# Altium schematic symbol library SCHLIB.SchLib: 2608 symbols (part 17 of 20)
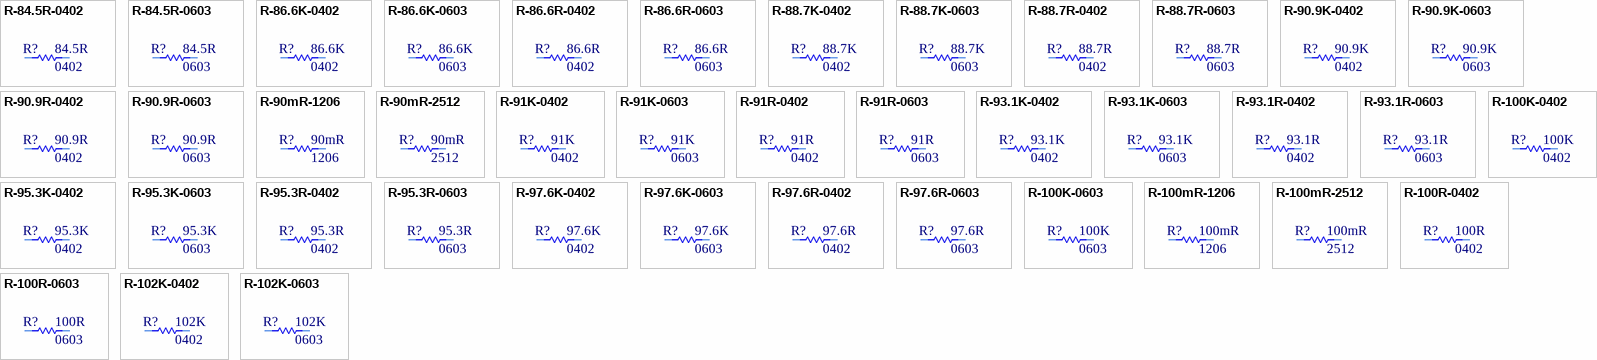
[diagram p99: symbols R-84.5R-0402 to R-102K-0603]

## R-100R-0402
designator R?, comment Package: 0402  (hidden comment: 100R)
RES 100 OHM 1% 1/16W 0402; Manufacturer Part Number: RC0402FR-07100RL; Manufacturer: YAGEO; Tolerance: 0.01; Power: 0.063W; Temperature Coefficient: ±100ppm/°C; Object  Type: Part; Design Item ID: R-100R-0402; Value: 100R; Composition: Thick Film; Features: Moisture Resistant; Operating Temperature: -55°C ~ 155°C; Height - Seated (Max): 0.40mm; Category: Resistor
footprint R0402
pins: 1, 2

## R-100R-0603
designator R?, comment Package: 0603  (hidden comment: 100R)
RES SMD 100 OHM 1% 1/10W 0603; Manufacturer Part Number: CRCW0603100RFKEA; Manufacturer: Vishay Dale; Tolerance: 0.01; Power: 0.1W; Temperature Coefficient: ±100ppm/°C; Object  Type: Part; Design Item ID: R-100R-0603; Value: 100R; Composition: Thick Film; Features: Automotive AEC-Q200; Operating Temperature: -55°C ~ 155°C; Height - Seated (Max): 0.50mm; Category: Resistor
footprint R0603
pins: 1, 2

## R-102K-0402
designator R?, comment Package: 0402  (hidden comment: 102K)
RES 102K OHM 1% 1/16W 0402; Manufacturer Part Number: RC0402FR-07102KL; Manufacturer: YAGEO; Tolerance: 0.01; Power: 0.063W; Temperature Coefficient: ±100ppm/°C; Object  Type: Part; Design Item ID: R-102K-0402; Value: 102K; Composition: Thick Film; Features: Moisture Resistant; Operating Temperature: -55°C ~ 155°C; Height - Seated (Max): 0.40mm; Category: Resistor
footprint R0402
pins: 1, 2

## R-102K-0603
designator R?, comment Package: 0603  (hidden comment: 102K)
RES SMD 102K OHM 1% 1/10W 0603; Manufacturer Part Number: CRCW0603102KFKEA; Manufacturer: Vishay Dale; Tolerance: 0.01; Power: 0.1W; Temperature Coefficient: ±100ppm/°C; Object  Type: Part; Design Item ID: R-102K-0603; Value: 102K; Composition: Thick Film; Features: Automotive AEC-Q200; Operating Temperature: -55°C ~ 155°C; Height - Seated (Max): 0.50mm; Category: Resistor
footprint R0603
pins: 1, 2

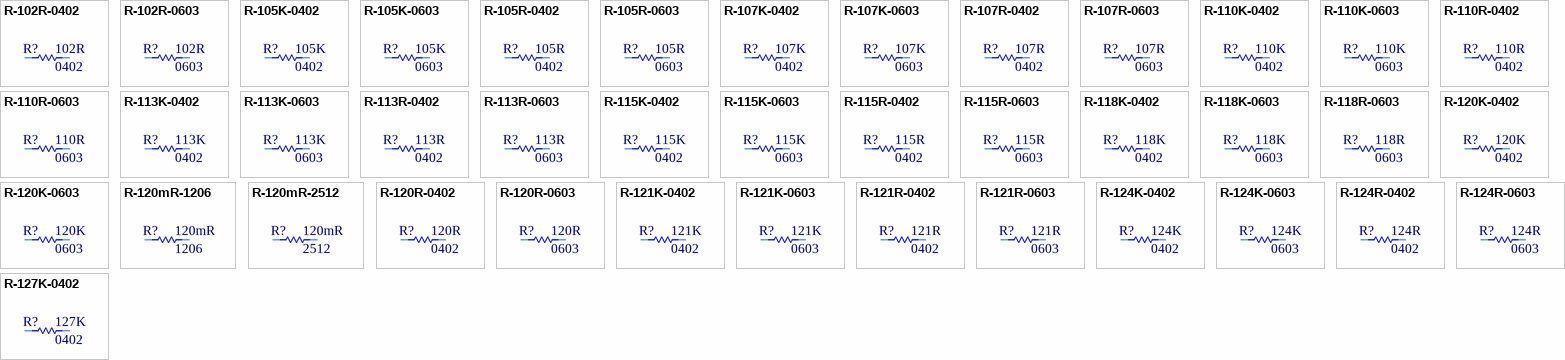
[diagram p70: symbols R-102R-0402 to R-127K-0402]

## R-102R-0402
designator R?, comment Package: 0402  (hidden comment: 102R)
RES 102 OHM 1% 1/16W 0402; Manufacturer Part Number: RC0402FR-07102RL; Manufacturer: YAGEO; Tolerance: 0.01; Power: 0.063W; Temperature Coefficient: ±100ppm/°C; Object  Type: Part; Design Item ID: R-102R-0402; Value: 102R; Composition: Thick Film; Features: Moisture Resistant; Operating Temperature: -55°C ~ 155°C; Height - Seated (Max): 0.40mm; Category: Resistor
footprint R0402
pins: 1, 2

## R-102R-0603
designator R?, comment Package: 0603  (hidden comment: 102R)
RES SMD 102 OHM 1% 1/10W 0603; Manufacturer Part Number: CRCW0603102RFKEA; Manufacturer: Vishay Dale; Tolerance: 0.01; Power: 0.1W; Temperature Coefficient: ±100ppm/°C; Object  Type: Part; Design Item ID: R-102R-0603; Value: 102R; Composition: Thick Film; Features: Automotive AEC-Q200; Operating Temperature: -55°C ~ 155°C; Height - Seated (Max): 0.50mm; Category: Resistor
footprint R0603
pins: 1, 2

## R-105K-0402
designator R?, comment Package: 0402  (hidden comment: 105K)
RES 105K OHM 1% 1/16W 0402; Manufacturer Part Number: RC0402FR-07105KL; Manufacturer: YAGEO; Tolerance: 0.01; Power: 0.063W; Temperature Coefficient: ±100ppm/°C; Object  Type: Part; Design Item ID: R-105K-0402; Value: 105K; Composition: Thick Film; Features: Moisture Resistant; Operating Temperature: -55°C ~ 155°C; Height - Seated (Max): 0.40mm; Category: Resistor
footprint R0402
pins: 1, 2

## R-105K-0603
designator R?, comment Package: 0603  (hidden comment: 105K)
RES SMD 105K OHM 1% 1/10W 0603; Manufacturer Part Number: CRCW0603105KFKEA; Manufacturer: Vishay Dale; Tolerance: 0.01; Power: 0.1W; Temperature Coefficient: ±100ppm/°C; Object  Type: Part; Design Item ID: R-105K-0603; Value: 105K; Composition: Thick Film; Features: Automotive AEC-Q200; Operating Temperature: -55°C ~ 155°C; Height - Seated (Max): 0.50mm; Category: Resistor
footprint R0603
pins: 1, 2

## R-105R-0402
designator R?, comment Package: 0402  (hidden comment: 105R)
RES 105 OHM 1% 1/16W 0402; Manufacturer Part Number: RC0402FR-07105RL; Manufacturer: YAGEO; Tolerance: 0.01; Power: 0.063W; Temperature Coefficient: ±100ppm/°C; Object  Type: Part; Design Item ID: R-105R-0402; Value: 105R; Composition: Thick Film; Features: Moisture Resistant; Operating Temperature: -55°C ~ 155°C; Height - Seated (Max): 0.40mm; Category: Resistor
footprint R0402
pins: 1, 2

## R-105R-0603
designator R?, comment Package: 0603  (hidden comment: 105R)
RES SMD 105 OHM 1% 1/10W 0603; Manufacturer Part Number: CRCW0603105RFKEA; Manufacturer: Vishay Dale; Tolerance: 0.01; Power: 0.1W; Temperature Coefficient: ±100ppm/°C; Object  Type: Part; Design Item ID: R-105R-0603; Value: 105R; Composition: Thick Film; Features: Automotive AEC-Q200; Operating Temperature: -55°C ~ 155°C; Height - Seated (Max): 0.50mm; Category: Resistor
footprint R0603
pins: 1, 2

## R-107K-0402
designator R?, comment Package: 0402  (hidden comment: 107K)
RES 107K OHM 1% 1/16W 0402; Manufacturer Part Number: RC0402FR-07107KL; Manufacturer: YAGEO; Tolerance: 0.01; Power: 0.063W; Temperature Coefficient: ±100ppm/°C; Object  Type: Part; Design Item ID: R-107K-0402; Value: 107K; Composition: Thick Film; Features: Moisture Resistant; Operating Temperature: -55°C ~ 155°C; Height - Seated (Max): 0.40mm; Category: Resistor
footprint R0402
pins: 1, 2

## R-107K-0603
designator R?, comment Package: 0603  (hidden comment: 107K)
RES SMD 107K OHM 1% 1/10W 0603; Manufacturer Part Number: CRCW0603107KFKEA; Manufacturer: Vishay Dale; Tolerance: 0.01; Power: 0.1W; Temperature Coefficient: ±100ppm/°C; Object  Type: Part; Design Item ID: R-107K-0603; Value: 107K; Composition: Thick Film; Features: Automotive AEC-Q200; Operating Temperature: -55°C ~ 155°C; Height - Seated (Max): 0.50mm; Category: Resistor
footprint R0603
pins: 1, 2

## R-107R-0402
designator R?, comment Package: 0402  (hidden comment: 107R)
RES 107 OHM 1% 1/16W 0402; Manufacturer Part Number: RC0402FR-07107RL; Manufacturer: YAGEO; Tolerance: 0.01; Power: 0.063W; Temperature Coefficient: ±100ppm/°C; Object  Type: Part; Design Item ID: R-107R-0402; Value: 107R; Composition: Thick Film; Features: Moisture Resistant; Operating Temperature: -55°C ~ 155°C; Height - Seated (Max): 0.40mm; Category: Resistor
footprint R0402
pins: 1, 2

## R-107R-0603
designator R?, comment Package: 0603  (hidden comment: 107R)
RES SMD 107 OHM 1% 1/10W 0603; Manufacturer Part Number: CRCW0603107RFKEA; Manufacturer: Vishay Dale; Tolerance: 0.01; Power: 0.1W; Temperature Coefficient: ±100ppm/°C; Object  Type: Part; Design Item ID: R-107R-0603; Value: 107R; Composition: Thick Film; Features: Automotive AEC-Q200; Operating Temperature: -55°C ~ 155°C; Height - Seated (Max): 0.50mm; Category: Resistor
footprint R0603
pins: 1, 2

## R-110K-0402
designator R?, comment Package: 0402  (hidden comment: 110K)
RES 110K OHM 1% 1/16W 0402; Manufacturer Part Number: RC0402FR-07110KL; Manufacturer: YAGEO; Tolerance: 0.01; Power: 0.063W; Temperature Coefficient: ±100ppm/°C; Object  Type: Part; Design Item ID: R-110K-0402; Value: 110K; Composition: Thick Film; Features: Moisture Resistant; Operating Temperature: -55°C ~ 155°C; Height - Seated (Max): 0.40mm; Category: Resistor
footprint R0402
pins: 1, 2

## R-110K-0603
designator R?, comment Package: 0603  (hidden comment: 110K)
RES SMD 110K OHM 1% 1/10W 0603; Manufacturer Part Number: CRCW0603110KFKEA; Manufacturer: Vishay Dale; Tolerance: 0.01; Power: 0.1W; Temperature Coefficient: ±100ppm/°C; Object  Type: Part; Design Item ID: R-110K-0603; Value: 110K; Composition: Thick Film; Features: Automotive AEC-Q200; Operating Temperature: -55°C ~ 155°C; Height - Seated (Max): 0.50mm; Category: Resistor
footprint R0603
pins: 1, 2

## R-110R-0402
designator R?, comment Package: 0402  (hidden comment: 110R)
RES 110 OHM 1% 1/16W 0402; Manufacturer Part Number: RC0402FR-07110RL; Manufacturer: YAGEO; Tolerance: 0.01; Power: 0.063W; Temperature Coefficient: ±100ppm/°C; Object  Type: Part; Design Item ID: R-110R-0402; Value: 110R; Composition: Thick Film; Features: Moisture Resistant; Operating Temperature: -55°C ~ 155°C; Height - Seated (Max): 0.40mm; Category: Resistor
footprint R0402
pins: 1, 2

## R-110R-0603
designator R?, comment Package: 0603  (hidden comment: 110R)
RES SMD 110 OHM 1% 1/10W 0603; Manufacturer Part Number: CRCW0603110RFKEA; Manufacturer: Vishay Dale; Tolerance: 0.01; Power: 0.1W; Temperature Coefficient: ±100ppm/°C; Object  Type: Part; Design Item ID: R-110R-0603; Value: 110R; Composition: Thick Film; Features: Automotive AEC-Q200; Operating Temperature: -55°C ~ 155°C; Height - Seated (Max): 0.50mm; Category: Resistor
footprint R0603
pins: 1, 2

## R-113K-0402
designator R?, comment Package: 0402  (hidden comment: 113K)
RES 113K OHM 1% 1/16W 0402; Manufacturer Part Number: RC0402FR-07113KL; Manufacturer: YAGEO; Tolerance: 0.01; Power: 0.063W; Temperature Coefficient: ±100ppm/°C; Object  Type: Part; Design Item ID: R-113K-0402; Value: 113K; Composition: Thick Film; Features: Moisture Resistant; Operating Temperature: -55°C ~ 155°C; Height - Seated (Max): 0.40mm; Category: Resistor
footprint R0402
pins: 1, 2

## R-113K-0603
designator R?, comment Package: 0603  (hidden comment: 113K)
RES SMD 113K OHM 1% 1/10W 0603; Manufacturer Part Number: CRCW0603113KFKEA; Manufacturer: Vishay Dale; Tolerance: 0.01; Power: 0.1W; Temperature Coefficient: ±100ppm/°C; Object  Type: Part; Design Item ID: R-113K-0603; Value: 113K; Composition: Thick Film; Features: Automotive AEC-Q200; Operating Temperature: -55°C ~ 155°C; Height - Seated (Max): 0.50mm; Category: Resistor
footprint R0603
pins: 1, 2

## R-113R-0402
designator R?, comment Package: 0402  (hidden comment: 113R)
RES 113 OHM 1% 1/16W 0402; Manufacturer Part Number: RC0402FR-07113RL; Manufacturer: YAGEO; Tolerance: 0.01; Power: 0.063W; Temperature Coefficient: ±100ppm/°C; Object  Type: Part; Design Item ID: R-113R-0402; Value: 113R; Composition: Thick Film; Features: Moisture Resistant; Operating Temperature: -55°C ~ 155°C; Height - Seated (Max): 0.40mm; Category: Resistor
footprint R0402
pins: 1, 2

## R-113R-0603
designator R?, comment Package: 0603  (hidden comment: 113R)
RES SMD 113 OHM 1% 1/10W 0603; Manufacturer Part Number: CRCW0603113RFKEA; Manufacturer: Vishay Dale; Tolerance: 0.01; Power: 0.1W; Temperature Coefficient: ±100ppm/°C; Object  Type: Part; Design Item ID: R-113R-0603; Value: 113R; Composition: Thick Film; Features: Automotive AEC-Q200; Operating Temperature: -55°C ~ 155°C; Height - Seated (Max): 0.50mm; Category: Resistor
footprint R0603
pins: 1, 2

## R-115K-0402
designator R?, comment Package: 0402  (hidden comment: 115K)
RES 115K OHM 1% 1/16W 0402; Manufacturer Part Number: RC0402FR-07115KL; Manufacturer: YAGEO; Tolerance: 0.01; Power: 0.063W; Temperature Coefficient: ±100ppm/°C; Object  Type: Part; Design Item ID: R-115K-0402; Value: 115K; Composition: Thick Film; Features: Moisture Resistant; Operating Temperature: -55°C ~ 155°C; Height - Seated (Max): 0.40mm; Category: Resistor
footprint R0402
pins: 1, 2

## R-115K-0603
designator R?, comment Package: 0603  (hidden comment: 115K)
RES SMD 115K OHM 1% 1/10W 0603; Manufacturer Part Number: CRCW0603115KFKEA; Manufacturer: Vishay Dale; Tolerance: 0.01; Power: 0.1W; Temperature Coefficient: ±100ppm/°C; Object  Type: Part; Design Item ID: R-115K-0603; Value: 115K; Composition: Thick Film; Features: Automotive AEC-Q200; Operating Temperature: -55°C ~ 155°C; Height - Seated (Max): 0.50mm; Category: Resistor
footprint R0603
pins: 1, 2

## R-115R-0402
designator R?, comment Package: 0402  (hidden comment: 115R)
RES 115 OHM 1% 1/16W 0402; Manufacturer Part Number: RC0402FR-07115RL; Manufacturer: YAGEO; Tolerance: 0.01; Power: 0.063W; Temperature Coefficient: ±100ppm/°C; Object  Type: Part; Design Item ID: R-115R-0402; Value: 115R; Composition: Thick Film; Features: Moisture Resistant; Operating Temperature: -55°C ~ 155°C; Height - Seated (Max): 0.40mm; Category: Resistor
footprint R0402
pins: 1, 2

## R-115R-0603
designator R?, comment Package: 0603  (hidden comment: 115R)
RES SMD 115 OHM 1% 1/10W 0603; Manufacturer Part Number: CRCW0603115RFKEA; Manufacturer: Vishay Dale; Tolerance: 0.01; Power: 0.1W; Temperature Coefficient: ±100ppm/°C; Object  Type: Part; Design Item ID: R-115R-0603; Value: 115R; Composition: Thick Film; Features: Automotive AEC-Q200; Operating Temperature: -55°C ~ 155°C; Height - Seated (Max): 0.50mm; Category: Resistor
footprint R0603
pins: 1, 2

## R-118K-0402
designator R?, comment Package: 0402  (hidden comment: 118K)
RES 118K OHM 1% 1/16W 0402; Manufacturer Part Number: RC0402FR-07118KL; Manufacturer: YAGEO; Tolerance: 0.01; Power: 0.063W; Temperature Coefficient: ±100ppm/°C; Object  Type: Part; Design Item ID: R-118K-0402; Value: 118K; Composition: Thick Film; Features: Moisture Resistant; Operating Temperature: -55°C ~ 155°C; Height - Seated (Max): 0.40mm; Category: Resistor
footprint R0402
pins: 1, 2

## R-118K-0603
designator R?, comment Package: 0603  (hidden comment: 118K)
RES SMD 118K OHM 1% 1/10W 0603; Manufacturer Part Number: CRCW0603118KFKEA; Manufacturer: Vishay Dale; Tolerance: 0.01; Power: 0.1W; Temperature Coefficient: ±100ppm/°C; Object  Type: Part; Design Item ID: R-118K-0603; Value: 118K; Composition: Thick Film; Features: Automotive AEC-Q200; Operating Temperature: -55°C ~ 155°C; Height - Seated (Max): 0.50mm; Category: Resistor
footprint R0603
pins: 1, 2

## R-118R-0603
designator R?, comment Package: 0603  (hidden comment: 118R)
RES SMD 118 OHM 1% 1/10W 0603; Manufacturer Part Number: CRCW0603118RFKEA; Manufacturer: Vishay Dale; Tolerance: 0.01; Power: 0.1W; Temperature Coefficient: ±100ppm/°C; Object  Type: Part; Design Item ID: R-118R-0603; Value: 118R; Composition: Thick Film; Features: Automotive AEC-Q200; Operating Temperature: -55°C ~ 155°C; Height - Seated (Max): 0.50mm; Category: Resistor
footprint R0603
pins: 1, 2

## R-120K-0402
designator R?, comment Package: 0402  (hidden comment: 120K)
RES 120K OHM 1% 1/16W 0402; Manufacturer Part Number: RC0402FR-07120KL; Manufacturer: YAGEO; Tolerance: 0.01; Power: 0.063W; Temperature Coefficient: ±100ppm/°C; Object  Type: Part; Design Item ID: R-120K-0402; Value: 120K; Composition: Thick Film; Features: Moisture Resistant; Operating Temperature: -55°C ~ 155°C; Height - Seated (Max): 0.40mm; Category: Resistor
footprint R0402
pins: 1, 2

## R-120K-0603
designator R?, comment Package: 0603  (hidden comment: 120K)
RES SMD 120K OHM 1% 1/10W 0603; Manufacturer Part Number: CRCW0603120KFKEA; Manufacturer: Vishay Dale; Tolerance: 0.01; Power: 0.1W; Temperature Coefficient: ±100ppm/°C; Object  Type: Part; Design Item ID: R-120K-0603; Value: 120K; Composition: Thick Film; Features: Automotive AEC-Q200; Operating Temperature: -55°C ~ 155°C; Height - Seated (Max): 0.50mm; Category: Resistor
footprint R0603
pins: 1, 2

## R-120mR-1206
designator R?, comment Package: 1206  (hidden comment: 120mR)
RES 0.12 OHM 1% 1/4W 1206; Manufacturer Part Number: WSL1206R1200FEA; Manufacturer: Vishay Dale; Tolerance: 0.01; Power: 0.25W; Temperature Coefficient: ±75ppm/°C; Object  Type: Part; Design Item ID: R-120mR-1206; Value: 120mR; Composition: Metal Element; Features: Anti-Sulfur, Automotive AEC-Q200, Current Sense, Moisture Resistant, Pulse Withstanding; Operating Temperature: -65°C ~ 170°C; Height - Seated (Max): 0.89mm; Category: Resistor
footprint R1206
pins: 1, 2

## R-120mR-2512
designator R?, comment Package: 2512  (hidden comment: 120mR)
RES 0.12 OHM 1% 1W 2512; Manufacturer Part Number: WSL2512R1200FEA; Manufacturer: Vishay Dale; Tolerance: 0.01; Temperature Coefficient: ±75ppm/°C; Object  Type: Part; Design Item ID: R-120mR-2512; Value: 120mR; Power: 1W; Composition: Metal Element; Features: Anti-Sulfur, Automotive AEC-Q200, Current Sense, Moisture Resistant, Pulse Withstanding; Operating Temperature: -65°C ~ 170°C; Height - Seated (Max): 0.89mm; Category: Resistor
footprint R2512
pins: 1, 2

## R-120R-0402
designator R?, comment Package: 0402  (hidden comment: 120R)
RES 120 OHM 1% 1/16W 0402; Manufacturer Part Number: RC0402FR-07120RL; Manufacturer: YAGEO; Tolerance: 0.01; Power: 0.063W; Temperature Coefficient: ±100ppm/°C; Object  Type: Part; Design Item ID: R-120R-0402; Value: 120R; Composition: Thick Film; Features: Moisture Resistant; Operating Temperature: -55°C ~ 155°C; Height - Seated (Max): 0.40mm; Category: Resistor
footprint R0402
pins: 1, 2

## R-120R-0603
designator R?, comment Package: 0603  (hidden comment: 120R)
RES SMD 120 OHM 1% 1/10W 0603; Manufacturer Part Number: CRCW0603120RFKEA; Manufacturer: Vishay Dale; Tolerance: 0.01; Power: 0.1W; Temperature Coefficient: ±100ppm/°C; Object  Type: Part; Design Item ID: R-120R-0603; Value: 120R; Composition: Thick Film; Features: Automotive AEC-Q200; Operating Temperature: -55°C ~ 155°C; Height - Seated (Max): 0.50mm; Category: Resistor
footprint R0603
pins: 1, 2

## R-121K-0402
designator R?, comment Package: 0402  (hidden comment: 121K)
RES 121K OHM 1% 1/16W 0402; Manufacturer Part Number: RC0402FR-07121KL; Manufacturer: YAGEO; Tolerance: 0.01; Power: 0.063W; Temperature Coefficient: ±100ppm/°C; Object  Type: Part; Design Item ID: R-121K-0402; Value: 121K; Composition: Thick Film; Features: Moisture Resistant; Operating Temperature: -55°C ~ 155°C; Height - Seated (Max): 0.40mm; Category: Resistor
footprint R0402
pins: 1, 2

## R-121K-0603
designator R?, comment Package: 0603  (hidden comment: 121K)
RES SMD 121K OHM 1% 1/10W 0603; Manufacturer Part Number: CRCW0603121KFKEA; Manufacturer: Vishay Dale; Tolerance: 0.01; Power: 0.1W; Temperature Coefficient: ±100ppm/°C; Object  Type: Part; Design Item ID: R-121K-0603; Value: 121K; Composition: Thick Film; Features: Automotive AEC-Q200; Operating Temperature: -55°C ~ 155°C; Height - Seated (Max): 0.50mm; Category: Resistor
footprint R0603
pins: 1, 2

## R-121R-0402
designator R?, comment Package: 0402  (hidden comment: 121R)
RES 121 OHM 1% 1/16W 0402; Manufacturer Part Number: RC0402FR-07121RL; Manufacturer: YAGEO; Tolerance: 0.01; Power: 0.063W; Temperature Coefficient: ±100ppm/°C; Object  Type: Part; Design Item ID: R-121R-0402; Value: 121R; Composition: Thick Film; Features: Moisture Resistant; Operating Temperature: -55°C ~ 155°C; Height - Seated (Max): 0.40mm; Category: Resistor
footprint R0402
pins: 1, 2

## R-121R-0603
designator R?, comment Package: 0603  (hidden comment: 121R)
RES SMD 121 OHM 1% 1/10W 0603; Manufacturer Part Number: CRCW0603121RFKEA; Manufacturer: Vishay Dale; Tolerance: 0.01; Power: 0.1W; Temperature Coefficient: ±100ppm/°C; Object  Type: Part; Design Item ID: R-121R-0603; Value: 121R; Composition: Thick Film; Features: Automotive AEC-Q200; Operating Temperature: -55°C ~ 155°C; Height - Seated (Max): 0.50mm; Category: Resistor
footprint R0603
pins: 1, 2

## R-124K-0402
designator R?, comment Package: 0402  (hidden comment: 124K)
RES 124K OHM 1% 1/16W 0402; Manufacturer Part Number: RC0402FR-07124KL; Manufacturer: YAGEO; Tolerance: 0.01; Power: 0.063W; Temperature Coefficient: ±100ppm/°C; Object  Type: Part; Design Item ID: R-124K-0402; Value: 124K; Composition: Thick Film; Features: Moisture Resistant; Operating Temperature: -55°C ~ 155°C; Height - Seated (Max): 0.40mm; Category: Resistor
footprint R0402
pins: 1, 2

## R-124K-0603
designator R?, comment Package: 0603  (hidden comment: 124K)
RES SMD 124K OHM 1% 1/10W 0603; Manufacturer Part Number: CRCW0603124KFKEA; Manufacturer: Vishay Dale; Tolerance: 0.01; Power: 0.1W; Temperature Coefficient: ±100ppm/°C; Object  Type: Part; Design Item ID: R-124K-0603; Value: 124K; Composition: Thick Film; Features: Automotive AEC-Q200; Operating Temperature: -55°C ~ 155°C; Height - Seated (Max): 0.50mm; Category: Resistor
footprint R0603
pins: 1, 2

## R-124R-0402
designator R?, comment Package: 0402  (hidden comment: 124R)
RES 124 OHM 1% 1/16W 0402; Manufacturer Part Number: RC0402FR-07124RL; Manufacturer: YAGEO; Tolerance: 0.01; Power: 0.063W; Temperature Coefficient: ±100ppm/°C; Object  Type: Part; Design Item ID: R-124R-0402; Value: 124R; Composition: Thick Film; Features: Moisture Resistant; Operating Temperature: -55°C ~ 155°C; Height - Seated (Max): 0.40mm; Category: Resistor
footprint R0402
pins: 1, 2

## R-124R-0603
designator R?, comment Package: 0603  (hidden comment: 124R)
RES SMD 124 OHM 1% 1/10W 0603; Manufacturer Part Number: CRCW0603124RFKEA; Manufacturer: Vishay Dale; Tolerance: 0.01; Power: 0.1W; Temperature Coefficient: ±100ppm/°C; Object  Type: Part; Design Item ID: R-124R-0603; Value: 124R; Composition: Thick Film; Features: Automotive AEC-Q200; Operating Temperature: -55°C ~ 155°C; Height - Seated (Max): 0.50mm; Category: Resistor
footprint R0603
pins: 1, 2

## R-127K-0402
designator R?, comment Package: 0402  (hidden comment: 127K)
RES 127K OHM 1% 1/16W 0402; Manufacturer Part Number: RC0402FR-07127KL; Manufacturer: YAGEO; Tolerance: 0.01; Power: 0.063W; Temperature Coefficient: ±100ppm/°C; Object  Type: Part; Design Item ID: R-127K-0402; Value: 127K; Composition: Thick Film; Features: Moisture Resistant; Operating Temperature: -55°C ~ 155°C; Height - Seated (Max): 0.40mm; Category: Resistor
footprint R0402
pins: 1, 2

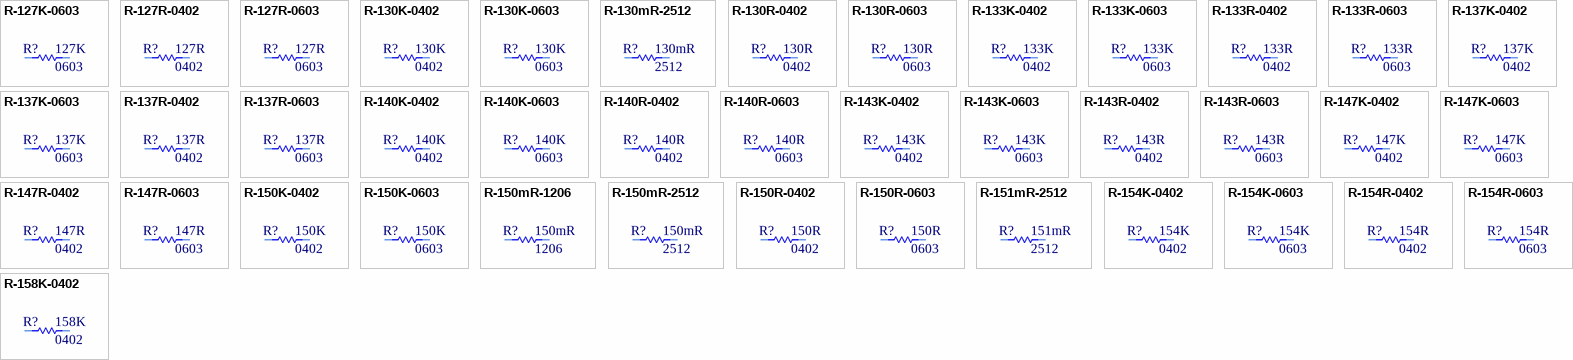
[diagram p71: symbols R-127K-0603 to R-158K-0402]

## R-127K-0603
designator R?, comment Package: 0603  (hidden comment: 127K)
RES SMD 127K OHM 1% 1/10W 0603; Manufacturer Part Number: CRCW0603127KFKEA; Manufacturer: Vishay Dale; Tolerance: 0.01; Power: 0.1W; Temperature Coefficient: ±100ppm/°C; Object  Type: Part; Design Item ID: R-127K-0603; Value: 127K; Composition: Thick Film; Features: Automotive AEC-Q200; Operating Temperature: -55°C ~ 155°C; Height - Seated (Max): 0.50mm; Category: Resistor
footprint R0603
pins: 1, 2

## R-127R-0402
designator R?, comment Package: 0402  (hidden comment: 127R)
RES 127 OHM 1% 1/16W 0402; Manufacturer Part Number: RC0402FR-07127RL; Manufacturer: YAGEO; Tolerance: 0.01; Power: 0.063W; Temperature Coefficient: ±100ppm/°C; Object  Type: Part; Design Item ID: R-127R-0402; Value: 127R; Composition: Thick Film; Features: Moisture Resistant; Operating Temperature: -55°C ~ 155°C; Height - Seated (Max): 0.40mm; Category: Resistor
footprint R0402
pins: 1, 2

## R-127R-0603
designator R?, comment Package: 0603  (hidden comment: 127R)
RES SMD 127 OHM 1% 1/10W 0603; Manufacturer Part Number: CRCW0603127RFKEA; Manufacturer: Vishay Dale; Tolerance: 0.01; Power: 0.1W; Temperature Coefficient: ±100ppm/°C; Object  Type: Part; Design Item ID: R-127R-0603; Value: 127R; Composition: Thick Film; Features: Automotive AEC-Q200; Operating Temperature: -55°C ~ 155°C; Height - Seated (Max): 0.50mm; Category: Resistor
footprint R0603
pins: 1, 2

## R-130K-0402
designator R?, comment Package: 0402  (hidden comment: 130K)
RES 130K OHM 1% 1/16W 0402; Manufacturer Part Number: RC0402FR-07130KL; Manufacturer: YAGEO; Tolerance: 0.01; Power: 0.063W; Temperature Coefficient: ±100ppm/°C; Object  Type: Part; Design Item ID: R-130K-0402; Value: 130K; Composition: Thick Film; Features: Moisture Resistant; Operating Temperature: -55°C ~ 155°C; Height - Seated (Max): 0.40mm; Category: Resistor
footprint R0402
pins: 1, 2

## R-130K-0603
designator R?, comment Package: 0603  (hidden comment: 130K)
RES SMD 130K OHM 1% 1/10W 0603; Manufacturer Part Number: CRCW0603130KFKEA; Manufacturer: Vishay Dale; Tolerance: 0.01; Power: 0.1W; Temperature Coefficient: ±100ppm/°C; Object  Type: Part; Design Item ID: R-130K-0603; Value: 130K; Composition: Thick Film; Features: Automotive AEC-Q200; Operating Temperature: -55°C ~ 155°C; Height - Seated (Max): 0.50mm; Category: Resistor
footprint R0603
pins: 1, 2

## R-130mR-2512
designator R?, comment Package: 2512  (hidden comment: 130mR)
RES 0.13 OHM 1% 1W 2512; Manufacturer Part Number: WSL2512R1300FEA; Manufacturer: Vishay Dale; Tolerance: 0.01; Temperature Coefficient: ±75ppm/°C; Object  Type: Part; Design Item ID: R-130mR-2512; Value: 130mR; Power: 1W; Composition: Metal Element; Features: Anti-Sulfur, Automotive AEC-Q200, Current Sense, Moisture Resistant, Pulse Withstanding; Operating Temperature: -65°C ~ 170°C; Height - Seated (Max): 0.89mm; Category: Resistor
footprint R2512
pins: 1, 2

## R-130R-0402
designator R?, comment Package: 0402  (hidden comment: 130R)
RES 130 OHM 1% 1/16W 0402; Manufacturer Part Number: RC0402FR-07130RL; Manufacturer: YAGEO; Tolerance: 0.01; Power: 0.063W; Temperature Coefficient: ±100ppm/°C; Object  Type: Part; Design Item ID: R-130R-0402; Value: 130R; Composition: Thick Film; Features: Moisture Resistant; Operating Temperature: -55°C ~ 155°C; Height - Seated (Max): 0.40mm; Category: Resistor
footprint R0402
pins: 1, 2

## R-130R-0603
designator R?, comment Package: 0603  (hidden comment: 130R)
RES SMD 130 OHM 1% 1/10W 0603; Manufacturer Part Number: CRCW0603130RFKEA; Manufacturer: Vishay Dale; Tolerance: 0.01; Power: 0.1W; Temperature Coefficient: ±100ppm/°C; Object  Type: Part; Design Item ID: R-130R-0603; Value: 130R; Composition: Thick Film; Features: Automotive AEC-Q200; Operating Temperature: -55°C ~ 155°C; Height - Seated (Max): 0.50mm; Category: Resistor
footprint R0603
pins: 1, 2

## R-133K-0402
designator R?, comment Package: 0402  (hidden comment: 133K)
RES 133K OHM 1% 1/16W 0402; Manufacturer Part Number: RC0402FR-07133KL; Manufacturer: YAGEO; Tolerance: 0.01; Power: 0.063W; Temperature Coefficient: ±100ppm/°C; Object  Type: Part; Design Item ID: R-133K-0402; Value: 133K; Composition: Thick Film; Features: Moisture Resistant; Operating Temperature: -55°C ~ 155°C; Height - Seated (Max): 0.40mm; Category: Resistor
footprint R0402
pins: 1, 2

## R-133K-0603
designator R?, comment Package: 0603  (hidden comment: 133K)
RES SMD 133K OHM 1% 1/10W 0603; Manufacturer Part Number: CRCW0603133KFKEA; Manufacturer: Vishay Dale; Tolerance: 0.01; Power: 0.1W; Temperature Coefficient: ±100ppm/°C; Object  Type: Part; Design Item ID: R-133K-0603; Value: 133K; Composition: Thick Film; Features: Automotive AEC-Q200; Operating Temperature: -55°C ~ 155°C; Height - Seated (Max): 0.50mm; Category: Resistor
footprint R0603
pins: 1, 2

## R-133R-0402
designator R?, comment Package: 0402  (hidden comment: 133R)
RES 133 OHM 1% 1/16W 0402; Manufacturer Part Number: RC0402FR-07133RL; Manufacturer: YAGEO; Tolerance: 0.01; Power: 0.063W; Temperature Coefficient: ±100ppm/°C; Object  Type: Part; Design Item ID: R-133R-0402; Value: 133R; Composition: Thick Film; Features: Moisture Resistant; Operating Temperature: -55°C ~ 155°C; Height - Seated (Max): 0.40mm; Category: Resistor
footprint R0402
pins: 1, 2

## R-133R-0603
designator R?, comment Package: 0603  (hidden comment: 133R)
RES SMD 133 OHM 1% 1/10W 0603; Manufacturer Part Number: CRCW0603133RFKEA; Manufacturer: Vishay Dale; Tolerance: 0.01; Power: 0.1W; Temperature Coefficient: ±100ppm/°C; Object  Type: Part; Design Item ID: R-133R-0603; Value: 133R; Composition: Thick Film; Features: Automotive AEC-Q200; Operating Temperature: -55°C ~ 155°C; Height - Seated (Max): 0.50mm; Category: Resistor
footprint R0603
pins: 1, 2

## R-137K-0402
designator R?, comment Package: 0402  (hidden comment: 137K)
RES 137K OHM 1% 1/16W 0402; Manufacturer Part Number: RC0402FR-07137KL; Manufacturer: YAGEO; Tolerance: 0.01; Power: 0.063W; Temperature Coefficient: ±100ppm/°C; Object  Type: Part; Design Item ID: R-137K-0402; Value: 137K; Composition: Thick Film; Features: Moisture Resistant; Operating Temperature: -55°C ~ 155°C; Height - Seated (Max): 0.40mm; Category: Resistor
footprint R0402
pins: 1, 2

## R-137K-0603
designator R?, comment Package: 0603  (hidden comment: 137K)
RES SMD 137K OHM 1% 1/10W 0603; Manufacturer Part Number: CRCW0603137KFKEA; Manufacturer: Vishay Dale; Tolerance: 0.01; Power: 0.1W; Temperature Coefficient: ±100ppm/°C; Object  Type: Part; Design Item ID: R-137K-0603; Value: 137K; Composition: Thick Film; Features: Automotive AEC-Q200; Operating Temperature: -55°C ~ 155°C; Height - Seated (Max): 0.50mm; Category: Resistor
footprint R0603
pins: 1, 2

## R-137R-0402
designator R?, comment Package: 0402  (hidden comment: 137R)
RES 137 OHM 1% 1/16W 0402; Manufacturer Part Number: RC0402FR-07137RL; Manufacturer: YAGEO; Tolerance: 0.01; Power: 0.063W; Temperature Coefficient: ±100ppm/°C; Object  Type: Part; Design Item ID: R-137R-0402; Value: 137R; Composition: Thick Film; Features: Moisture Resistant; Operating Temperature: -55°C ~ 155°C; Height - Seated (Max): 0.40mm; Category: Resistor
footprint R0402
pins: 1, 2

## R-137R-0603
designator R?, comment Package: 0603  (hidden comment: 137R)
RES SMD 137 OHM 1% 1/10W 0603; Manufacturer Part Number: CRCW0603137RFKEA; Manufacturer: Vishay Dale; Tolerance: 0.01; Power: 0.1W; Temperature Coefficient: ±100ppm/°C; Object  Type: Part; Design Item ID: R-137R-0603; Value: 137R; Composition: Thick Film; Features: Automotive AEC-Q200; Operating Temperature: -55°C ~ 155°C; Height - Seated (Max): 0.50mm; Category: Resistor
footprint R0603
pins: 1, 2

## R-140K-0402
designator R?, comment Package: 0402  (hidden comment: 140K)
RES 140K OHM 1% 1/16W 0402; Manufacturer Part Number: RC0402FR-07140KL; Manufacturer: YAGEO; Tolerance: 0.01; Power: 0.063W; Temperature Coefficient: ±100ppm/°C; Object  Type: Part; Design Item ID: R-140K-0402; Value: 140K; Composition: Thick Film; Features: Moisture Resistant; Operating Temperature: -55°C ~ 155°C; Height - Seated (Max): 0.40mm; Category: Resistor
footprint R0402
pins: 1, 2

## R-140K-0603
designator R?, comment Package: 0603  (hidden comment: 140K)
RES SMD 140K OHM 1% 1/10W 0603; Manufacturer Part Number: CRCW0603140KFKEA; Manufacturer: Vishay Dale; Tolerance: 0.01; Power: 0.1W; Temperature Coefficient: ±100ppm/°C; Object  Type: Part; Design Item ID: R-140K-0603; Value: 140K; Composition: Thick Film; Features: Automotive AEC-Q200; Operating Temperature: -55°C ~ 155°C; Height - Seated (Max): 0.50mm; Category: Resistor
footprint R0603
pins: 1, 2

## R-140R-0402
designator R?, comment Package: 0402  (hidden comment: 140R)
RES 140 OHM 1% 1/16W 0402; Manufacturer Part Number: RC0402FR-07140RL; Manufacturer: YAGEO; Tolerance: 0.01; Power: 0.063W; Temperature Coefficient: ±100ppm/°C; Object  Type: Part; Design Item ID: R-140R-0402; Value: 140R; Composition: Thick Film; Features: Moisture Resistant; Operating Temperature: -55°C ~ 155°C; Height - Seated (Max): 0.40mm; Category: Resistor
footprint R0402
pins: 1, 2

## R-140R-0603
designator R?, comment Package: 0603  (hidden comment: 140R)
RES SMD 140 OHM 1% 1/10W 0603; Manufacturer Part Number: CRCW0603140RFKEA; Manufacturer: Vishay Dale; Tolerance: 0.01; Power: 0.1W; Temperature Coefficient: ±100ppm/°C; Object  Type: Part; Design Item ID: R-140R-0603; Value: 140R; Composition: Thick Film; Features: Automotive AEC-Q200; Operating Temperature: -55°C ~ 155°C; Height - Seated (Max): 0.50mm; Category: Resistor
footprint R0603
pins: 1, 2

## R-143K-0402
designator R?, comment Package: 0402  (hidden comment: 143K)
RES 143K OHM 1% 1/16W 0402; Manufacturer Part Number: RC0402FR-07143KL; Manufacturer: YAGEO; Tolerance: 0.01; Power: 0.063W; Temperature Coefficient: ±100ppm/°C; Object  Type: Part; Design Item ID: R-143K-0402; Value: 143K; Composition: Thick Film; Features: Moisture Resistant; Operating Temperature: -55°C ~ 155°C; Height - Seated (Max): 0.40mm; Category: Resistor
footprint R0402
pins: 1, 2

## R-143K-0603
designator R?, comment Package: 0603  (hidden comment: 143K)
RES SMD 143K OHM 1% 1/10W 0603; Manufacturer Part Number: CRCW0603143KFKEA; Manufacturer: Vishay Dale; Tolerance: 0.01; Power: 0.1W; Temperature Coefficient: ±100ppm/°C; Object  Type: Part; Design Item ID: R-143K-0603; Value: 143K; Composition: Thick Film; Features: Automotive AEC-Q200; Operating Temperature: -55°C ~ 155°C; Height - Seated (Max): 0.50mm; Category: Resistor
footprint R0603
pins: 1, 2

## R-143R-0402
designator R?, comment Package: 0402  (hidden comment: 143R)
RES 143 OHM 1% 1/16W 0402; Manufacturer Part Number: RC0402FR-07143RL; Manufacturer: YAGEO; Tolerance: 0.01; Power: 0.063W; Temperature Coefficient: ±100ppm/°C; Object  Type: Part; Design Item ID: R-143R-0402; Value: 143R; Composition: Thick Film; Features: Moisture Resistant; Operating Temperature: -55°C ~ 155°C; Height - Seated (Max): 0.40mm; Category: Resistor
footprint R0402
pins: 1, 2

## R-143R-0603
designator R?, comment Package: 0603  (hidden comment: 143R)
RES SMD 143 OHM 1% 1/10W 0603; Manufacturer Part Number: CRCW0603143RFKEA; Manufacturer: Vishay Dale; Tolerance: 0.01; Power: 0.1W; Temperature Coefficient: ±100ppm/°C; Object  Type: Part; Design Item ID: R-143R-0603; Value: 143R; Composition: Thick Film; Features: Automotive AEC-Q200; Operating Temperature: -55°C ~ 155°C; Height - Seated (Max): 0.50mm; Category: Resistor
footprint R0603
pins: 1, 2

## R-147K-0402
designator R?, comment Package: 0402  (hidden comment: 147K)
RES 147K OHM 1% 1/16W 0402; Manufacturer Part Number: RC0402FR-07147KL; Manufacturer: YAGEO; Tolerance: 0.01; Power: 0.063W; Temperature Coefficient: ±100ppm/°C; Object  Type: Part; Design Item ID: R-147K-0402; Value: 147K; Composition: Thick Film; Features: Moisture Resistant; Operating Temperature: -55°C ~ 155°C; Height - Seated (Max): 0.40mm; Category: Resistor
footprint R0402
pins: 1, 2

## R-147K-0603
designator R?, comment Package: 0603  (hidden comment: 147K)
RES SMD 147K OHM 1% 1/10W 0603; Manufacturer Part Number: CRCW0603147KFKEA; Manufacturer: Vishay Dale; Tolerance: 0.01; Power: 0.1W; Temperature Coefficient: ±100ppm/°C; Object  Type: Part; Design Item ID: R-147K-0603; Value: 147K; Composition: Thick Film; Features: Automotive AEC-Q200; Operating Temperature: -55°C ~ 155°C; Height - Seated (Max): 0.50mm; Category: Resistor
footprint R0603
pins: 1, 2

## R-147R-0402
designator R?, comment Package: 0402  (hidden comment: 147R)
RES 147 OHM 1% 1/16W 0402; Manufacturer Part Number: RC0402FR-07147RL; Manufacturer: YAGEO; Tolerance: 0.01; Power: 0.063W; Temperature Coefficient: ±100ppm/°C; Object  Type: Part; Design Item ID: R-147R-0402; Value: 147R; Composition: Thick Film; Features: Moisture Resistant; Operating Temperature: -55°C ~ 155°C; Height - Seated (Max): 0.40mm; Category: Resistor
footprint R0402
pins: 1, 2

## R-147R-0603
designator R?, comment Package: 0603  (hidden comment: 147R)
RES SMD 147 OHM 1% 1/10W 0603; Manufacturer Part Number: CRCW0603147RFKEA; Manufacturer: Vishay Dale; Tolerance: 0.01; Power: 0.1W; Temperature Coefficient: ±100ppm/°C; Object  Type: Part; Design Item ID: R-147R-0603; Value: 147R; Composition: Thick Film; Features: Automotive AEC-Q200; Operating Temperature: -55°C ~ 155°C; Height - Seated (Max): 0.50mm; Category: Resistor
footprint R0603
pins: 1, 2

## R-150K-0402
designator R?, comment Package: 0402  (hidden comment: 150K)
RES 150K OHM 1% 1/16W 0402; Manufacturer Part Number: RC0402FR-07150KL; Manufacturer: YAGEO; Tolerance: 0.01; Power: 0.063W; Temperature Coefficient: ±100ppm/°C; Object  Type: Part; Design Item ID: R-150K-0402; Value: 150K; Composition: Thick Film; Features: Moisture Resistant; Operating Temperature: -55°C ~ 155°C; Height - Seated (Max): 0.40mm; Category: Resistor
footprint R0402
pins: 1, 2

## R-150K-0603
designator R?, comment Package: 0603  (hidden comment: 150K)
RES SMD 150K OHM 1% 1/10W 0603; Manufacturer Part Number: CRCW0603150KFKEA; Manufacturer: Vishay Dale; Tolerance: 0.01; Power: 0.1W; Temperature Coefficient: ±100ppm/°C; Object  Type: Part; Design Item ID: R-150K-0603; Value: 150K; Composition: Thick Film; Features: Automotive AEC-Q200; Operating Temperature: -55°C ~ 155°C; Height - Seated (Max): 0.50mm; Category: Resistor
footprint R0603
pins: 1, 2

## R-150mR-1206
designator R?, comment Package: 1206  (hidden comment: 150mR)
RES 0.15 OHM 1% 1/4W 1206; Manufacturer Part Number: WSL1206R1500FEA; Manufacturer: Vishay Dale; Tolerance: 0.01; Power: 0.25W; Temperature Coefficient: ±75ppm/°C; Object  Type: Part; Design Item ID: R-150mR-1206; Value: 150mR; Composition: Metal Element; Features: Anti-Sulfur, Automotive AEC-Q200, Current Sense, Moisture Resistant, Pulse Withstanding; Operating Temperature: -65°C ~ 170°C; Height - Seated (Max): 0.89mm; Category: Resistor
footprint R1206
pins: 1, 2

## R-150mR-2512
designator R?, comment Package: 2512  (hidden comment: 150mR)
RES 0.15 OHM 1% 1W 2512; Manufacturer Part Number: WSL2512R1500FEA; Manufacturer: Vishay Dale; Tolerance: 0.01; Temperature Coefficient: ±75ppm/°C; Object  Type: Part; Design Item ID: R-150mR-2512; Value: 150mR; Power: 1W; Composition: Metal Element; Features: Anti-Sulfur, Automotive AEC-Q200, Current Sense, Moisture Resistant, Pulse Withstanding; Operating Temperature: -65°C ~ 170°C; Height - Seated (Max): 0.89mm; Category: Resistor
footprint R2512
pins: 1, 2

## R-150R-0402
designator R?, comment Package: 0402  (hidden comment: 150R)
RES 150 OHM 1% 1/16W 0402; Manufacturer Part Number: RC0402FR-07150RL; Manufacturer: YAGEO; Tolerance: 0.01; Power: 0.063W; Temperature Coefficient: ±100ppm/°C; Object  Type: Part; Design Item ID: R-150R-0402; Value: 150R; Composition: Thick Film; Features: Moisture Resistant; Operating Temperature: -55°C ~ 155°C; Height - Seated (Max): 0.40mm; Category: Resistor
footprint R0402
pins: 1, 2

## R-150R-0603
designator R?, comment Package: 0603  (hidden comment: 150R)
RES SMD 150 OHM 1% 1/10W 0603; Manufacturer Part Number: CRCW0603150RFKEA; Manufacturer: Vishay Dale; Tolerance: 0.01; Power: 0.1W; Temperature Coefficient: ±100ppm/°C; Object  Type: Part; Design Item ID: R-150R-0603; Value: 150R; Composition: Thick Film; Features: Automotive AEC-Q200; Operating Temperature: -55°C ~ 155°C; Height - Seated (Max): 0.50mm; Category: Resistor
footprint R0603
pins: 1, 2

## R-151mR-2512
designator R?, comment Package: 2512  (hidden comment: 151mR)
RES 0.151 OHM 1% 1W 2512; Manufacturer Part Number: WSL2512R1510FEA; Manufacturer: Vishay Dale; Tolerance: 0.01; Temperature Coefficient: ±75ppm/°C; Object  Type: Part; Design Item ID: R-151mR-2512; Value: 151mR; Power: 1W; Composition: Metal Element; Features: Anti-Sulfur, Automotive AEC-Q200, Current Sense, Moisture Resistant, Pulse Withstanding; Operating Temperature: -65°C ~ 170°C; Height - Seated (Max): 0.89mm; Category: Resistor
footprint R2512
pins: 1, 2

## R-154K-0402
designator R?, comment Package: 0402  (hidden comment: 154K)
RES 154K OHM 1% 1/16W 0402; Manufacturer Part Number: RC0402FR-07154KL; Manufacturer: YAGEO; Tolerance: 0.01; Power: 0.063W; Temperature Coefficient: ±100ppm/°C; Object  Type: Part; Design Item ID: R-154K-0402; Value: 154K; Composition: Thick Film; Features: Moisture Resistant; Operating Temperature: -55°C ~ 155°C; Height - Seated (Max): 0.40mm; Category: Resistor
footprint R0402
pins: 1, 2

## R-154K-0603
designator R?, comment Package: 0603  (hidden comment: 154K)
RES SMD 154K OHM 1% 1/10W 0603; Manufacturer Part Number: CRCW0603154KFKEA; Manufacturer: Vishay Dale; Tolerance: 0.01; Power: 0.1W; Temperature Coefficient: ±100ppm/°C; Object  Type: Part; Design Item ID: R-154K-0603; Value: 154K; Composition: Thick Film; Features: Automotive AEC-Q200; Operating Temperature: -55°C ~ 155°C; Height - Seated (Max): 0.50mm; Category: Resistor
footprint R0603
pins: 1, 2

## R-154R-0402
designator R?, comment Package: 0402  (hidden comment: 154R)
RES 154 OHM 1% 1/16W 0402; Manufacturer Part Number: RC0402FR-07154RL; Manufacturer: YAGEO; Tolerance: 0.01; Power: 0.063W; Temperature Coefficient: ±100ppm/°C; Object  Type: Part; Design Item ID: R-154R-0402; Value: 154R; Composition: Thick Film; Features: Moisture Resistant; Operating Temperature: -55°C ~ 155°C; Height - Seated (Max): 0.40mm; Category: Resistor
footprint R0402
pins: 1, 2

## R-154R-0603
designator R?, comment Package: 0603  (hidden comment: 154R)
RES SMD 154 OHM 1% 1/10W 0603; Manufacturer Part Number: CRCW0603154RFKEA; Manufacturer: Vishay Dale; Tolerance: 0.01; Power: 0.1W; Temperature Coefficient: ±100ppm/°C; Object  Type: Part; Design Item ID: R-154R-0603; Value: 154R; Composition: Thick Film; Features: Automotive AEC-Q200; Operating Temperature: -55°C ~ 155°C; Height - Seated (Max): 0.50mm; Category: Resistor
footprint R0603
pins: 1, 2

## R-158K-0402
designator R?, comment Package: 0402  (hidden comment: 158K)
RES 158K OHM 1% 1/16W 0402; Manufacturer Part Number: RC0402FR-07158KL; Manufacturer: YAGEO; Tolerance: 0.01; Power: 0.063W; Temperature Coefficient: ±100ppm/°C; Object  Type: Part; Design Item ID: R-158K-0402; Value: 158K; Composition: Thick Film; Features: Moisture Resistant; Operating Temperature: -55°C ~ 155°C; Height - Seated (Max): 0.40mm; Category: Resistor
footprint R0402
pins: 1, 2
